# Altium footprint library SEMICONDUCTORS.PcbLib: 91 footprints (part 2 of 6)
Each footprint in its own frame and in the unit in brackets; x right, y up, seen from the top. Pads: shape width x height; smd on the part's side, far side on the other; paste and mask are expansions set on the pad; w line width, h text height; cw(c..) or ccw(c..) is an arc to the next point about the centre after c.
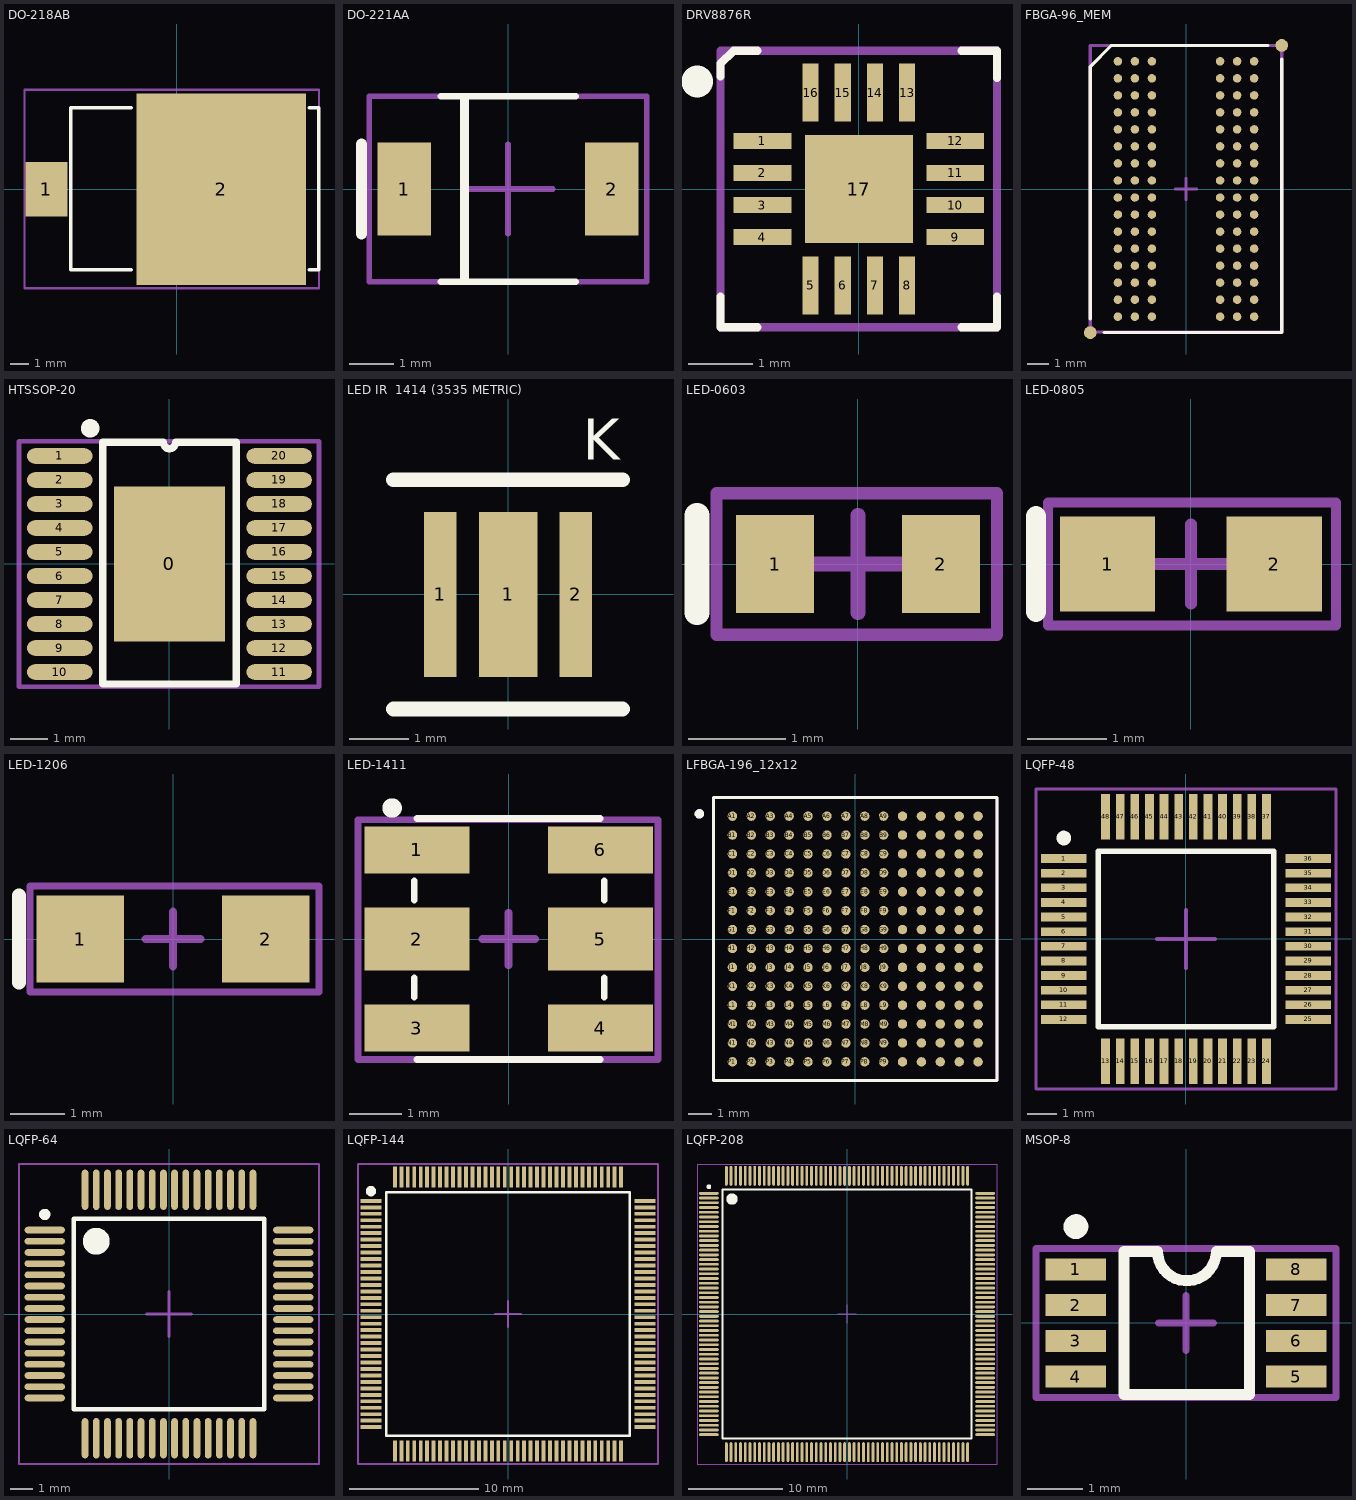
[diagram p1: the footprints below, top view; thin cyan lines are the x and y axes]

## DO-218AB [mm]
height 5
pads (2):
  rect 2.3x3 smd: 1(-7.15,0)
  rect 9.3x10.5 smd: 2(2.45,0)
Top Overlay:
  lines w0.2: -2.503,-4.42 -5.805,-4.42 -5.805,4.47 -2.503,4.47 ; 7.276,-4.42 7.784,-4.42 7.784,4.47 7.276,4.47
Top Assembly:
  lines w0.127: -8.345,-5.425 7.8,-5.425 7.8,5.45 -8.345,5.45 -8.345,-5.425
  text ".Designator" at -1.85,-0.75 h1.5
Top Component Center:
  lines w0.127: -1,0 1,0 ; 0,-1 0,1
Mechanical 15:
  lines w0.1: -1.55,0.025 -0.55,0.025 ; -1.05,-0.475 -1.05,0.525
3D body "DO-218AB.step": height 5, standoff 0, extent -7.7,-5 7.729,5

## DO-221AA [mm]
pads (2):
  rect 1.2x2.07 smd: 1(-2.32,0) 2(2.32,0)
Top Overlay:
  lines w0.15: -1.5,-2.075 1.509,-2.075 ; -1.5,2.075 1.514,2.075
  lines w0.2: -0.975,-1.994 -0.975,2.044
  lines w0.25: -3.275,-1 -3.275,1
Top Assembly:
  lines w0.127: -3.1,-2.075 3.1,-2.075 3.1,2.075 -3.1,2.075 -3.1,-2.075
  text ".Designator" at -2.3,-0.525 h1.2
Top Component Center:
  lines w0.127: -1,0 1,0 ; 0,-1 0,1
3D body "DO-221AA.step": height 1, standoff 0, extent -2.9,-1.975 2.9,1.975

## DRV8876R [mm]
pads (17):
  rect 0.9x0.25 smd: 1(-1.5,0.75) 2(-1.5,0.25) 3(-1.5,-0.25) 4(-1.5,-0.75) 9(1.5,-0.75) 10(1.5,-0.25) 11(1.5,0.25) 12(1.5,0.75)
  rect 0.25x0.9 smd: 5(-0.75,-1.5) 6(-0.25,-1.5) 7(0.25,-1.5) 8(0.75,-1.5) 13(0.75,1.5) 14(0.25,1.5) 15(-0.25,1.5) 16(-0.75,1.5)
  rect 1.68x1.68 smd: 17(0,0)
Top Overlay:
  lines w0.127: -2.15,-1.675 -2.15,-2.15 -1.575,-2.15 ; -2.15,1.75 -2.15,1.95 -1.95,2.15 -1.575,2.15 ; 1.6,-2.15 2.15,-2.15 2.15,-1.675 ; 1.6,2.15 2.15,2.15 2.15,1.725
  lines w0.5: -2.517,1.673 -2.517,1.673
Top Assembly:
  lines w0.127: -2.15,-2.15 -2.15,2.15 2.15,2.15 2.15,-2.15 -2.15,-2.15
  text ".Designator" at -0.75,-0.25 h0.8
Top Component Center:
  lines w0.127: -0.5,0 0.5,0 ; 0,-0.5 0,0.5
3D body: height 0.25, standoff 0, extent 5.225,2.475 5.225,2.475
3D body "DRV8876RGTR.STEP": height 1, standoff 0, extent -1.5,-1.5 1.5,1.5

## FBGA-96_MEM [mm]
pads (98):
  round 0.4 smd: A1(-3.2,6) A2(-2.4,6) A3(-1.6,6) A7(1.6,6) A8(2.4,6) A9(3.2,6) B1(-3.2,5.2) B2(-2.4,5.2) B3(-1.6,5.2) B7(1.6,5.2) B8(2.4,5.2) B9(3.2,5.2) C1(-3.2,4.4) C2(-2.4,4.4) C3(-1.6,4.4) C7(1.6,4.4) C8(2.4,4.4) C9(3.2,4.4) D1(-3.2,3.6) D2(-2.4,3.6) D3(-1.6,3.6) D7(1.6,3.6) D8(2.4,3.6) D9(3.2,3.6) E1(-3.2,2.8) E2(-2.4,2.8) E3(-1.6,2.8) E7(1.6,2.8) E8(2.4,2.8) E9(3.2,2.8) F1(-3.2,2) F2(-2.4,2) F3(-1.6,2) F7(1.6,2) F8(2.4,2) F9(3.2,2) G1(-3.2,1.2) G2(-2.4,1.2) G3(-1.6,1.2) G7(1.6,1.2) G8(2.4,1.2) G9(3.2,1.2) H1(-3.2,0.4) H2(-2.4,0.4) H3(-1.6,0.4) H7(1.6,0.4) H8(2.4,0.4) H9(3.2,0.4) J1(-3.2,-0.4) J2(-2.4,-0.4) J3(-1.6,-0.4) J7(1.6,-0.4) J8(2.4,-0.4) J9(3.2,-0.4) K1(-3.2,-1.2) K2(-2.4,-1.2) K3(-1.6,-1.2) K7(1.6,-1.2) K8(2.4,-1.2) K9(3.2,-1.2) L1(-3.2,-2) L2(-2.4,-2) L3(-1.6,-2) L7(1.6,-2) L8(2.4,-2) L9(3.2,-2) M1(-3.2,-2.8) M2(-2.4,-2.8) M3(-1.6,-2.8) M7(1.6,-2.8) M8(2.4,-2.8) M9(3.2,-2.8) N1(-3.2,-3.6) N2(-2.4,-3.6) N3(-1.6,-3.6) N7(1.6,-3.6) N8(2.4,-3.6) N9(3.2,-3.6) P1(-3.2,-4.4) P2(-2.4,-4.4) P3(-1.6,-4.4) P7(1.6,-4.4) P8(2.4,-4.4) P9(3.2,-4.4) R1(-3.2,-5.2) R2(-2.4,-5.2) R3(-1.6,-5.2) R7(1.6,-5.2) R8(2.4,-5.2) R9(3.2,-5.2) T1(-3.2,-6) T2(-2.4,-6) T3(-1.6,-6) T7(1.6,-6) T8(2.4,-6) T9(3.2,-6)
  round 0.6 smd paste-0.381: FID1(-4.5,-6.75) FID2(4.5,6.75)
Top Overlay:
  lines w0.15: -4.5,-6.1 -4.5,5.75 -3.5,6.75 3.85,6.75 ; -3.85,-6.75 4.5,-6.75 4.5,6.1
Top Assembly:
  lines w0.15: -4.5,-6.725 4.5,-6.725 4.5,6.75 -4.5,6.75 -4.5,-6.725
  text ".Designator" at 0.45,-3.625 h1.2
Top Component Center:
  lines w0.127: -0.5,0 0.5,0 ; 0,-0.5 0,0.5
3D body "FBGA-96_MEM.STEP": height 1.17, standoff -0.03, extent -4.5,-6.5 4.5,6.5

## HTSSOP-20 [mm]
pads (21):
  rect 3x4.2 smd: 0(0,0)
  oval 1.78x0.42 smd: 1(-2.97,2.925) 2(-2.97,2.275) 3(-2.97,1.625) 4(-2.97,0.975) 5(-2.97,0.325) 6(-2.97,-0.325) 7(-2.97,-0.975) 8(-2.97,-1.625) 9(-2.97,-2.275) 10(-2.97,-2.925) 11(2.97,-2.925) 12(2.97,-2.275) 13(2.97,-1.625) 14(2.97,-0.975) 15(2.97,-0.325) 16(2.97,0.325) 17(2.97,0.975) 18(2.97,1.625) 19(2.97,2.275) 20(2.97,2.925)
Top Overlay:
  circle w0.25: c-2.149,3.675 r0.125
  lines w0.2: -1.805,-3.25 1.802,-3.25 1.805,-3.247 1.805,-1.217 1.805,0.814 1.805,3.25 ; -1.805,-3.247 -1.805,3.25 ; -1.805,3.3 -0.162,3.3 ccw(c0,3.288) 0.162,3.3 1.805,3.3 ; -1.751,-3.247 -1.748,-3.25
Top Assembly:
  lines w0.127: -4.075,-3.325 -4.075,3.325 4.05,3.325 4.05,-3.325 -4.075,-3.325
  text ".Designator" at 0.3,-1.725 h1.2
Top Component Center:
  lines w0.127: -0.5,0 0.5,0 ; 0,-0.5 0,0.5
3D body "HTSSOP-20.STEP": height 1.1, standoff 0, extent -3.2,-3.25 3.2,3.25

## LED IR  1414 (3535 METRIC) [mm] "EMITTER IR 850NM 3SMD"
height 3
pads (3):
  rect 0.55x2.8 smd paste-0.05 mask+0.04: 1(-1.15,0) 2(1.15,0)
  rect 1x2.8 smd paste-1 mask+0.04: 1(0.003,0)
Top Overlay:
  lines w0.254: -1.95,-1.95 1.95,-1.95 ; -1.95,1.95 1.95,1.95
  text "K" at 1.27,2.286 h0.7
Top Paste:
  rectangle: -0.45,0.15 0.45,1.35
  rectangle: -0.45,-1.35 0.45,-0.15
3D body: height 0.73, standoff 0, extent -2.032,-1.778 2.032,1.778
3D body: height 2.99, standoff 0.73, extent -1.53,-1.529 1.53,1.53

## LED-0603 [mm]
pads (2):
  rect 0.8x1 smd: 1(-0.85,0) 2(0.85,0)
Top Overlay:
  lines w0.254: -1.65,-0.5 -1.65,0.5
Top Assembly:
  lines w0.127: -1.45,-0.725 -1.45,0.725 1.425,0.725 1.425,-0.725 -1.45,-0.725
  text ".Designator" at -1.35,-0.325 h0.8
Top Component Center:
  lines w0.15: -0.5,0 0.5,0 ; 0,-0.5 0,0.5
3D body: height 1.27, standoff 0, extent -1.775,1.05 -1.775,1.05
3D body: height 1.27, standoff 0, extent -1.775,1.05 -1.775,1.05
3D body: height 0.25, standoff 0, extent -0.8,-0.5 0.8,0.5
3D body: height 0.3, standoff 0, extent -0.812,-0.512 -0.287,0.513
3D body: height 0.3, standoff 0, extent 0.287,-0.512 0.812,0.513
3D body: height 0.55, standoff 0.2, extent -0.55,-0.5 0.55,0.5
3D body: height 0.4, standoff 0.3, extent -0.35,-0.378 0.35,0.378

## LED-0805 [mm]
pads (2):
  rect 1.2x1.2 smd: 1(-1.05,0) 2(1.05,0)
Top Overlay:
  lines w0.254: -1.95,-0.6 -1.95,0.6
Top Assembly:
  lines w0.127: -1.8,-0.775 1.825,-0.775 1.825,0.775 -1.8,0.775 -1.8,-0.775
  text ".Designator" at -1.35,-0.325 h0.8
Top Component Center:
  lines w0.15: -0.5,0 0.5,0 ; 0,-0.5 0,0.5
3D body: height 0.55, standoff 0.45, extent -0.35,-0.378 0.35,0.378
3D body: height 1.1, standoff 0.4, extent -0.7,-0.612 0.7,0.613
3D body: height 0.51, standoff 0, extent 0.488,-0.637 1.012,0.638
3D body: height 0.51, standoff 0, extent -1.012,-0.637 -0.487,0.638
3D body: height 0.5, standoff 0, extent -1,-0.625 1,0.625
3D body: height 1.27, standoff 0, extent -1.775,1.05 -1.775,1.05
3D body: height 1.27, standoff 0, extent -1.775,1.05 -1.775,1.05

## LED-1206 [mm]
pads (2):
  rect 1.6x1.6 smd: 1(-1.7,0) 2(1.7,0)
Top Overlay:
  lines w0.254: -2.825,-0.8 -2.825,0.8
Top Assembly:
  lines w0.127: -2.625,-0.975 2.675,-0.975 2.675,0.975 -2.625,0.975 -2.625,-0.975
  text ".Designator" at -1.587,-0.475 h1
Top Component Center:
  lines w0.15: -0.5,0 0.5,0 ; 0,-0.5 0,0.5
3D body: height 0.51, standoff 0, extent 1.088,-0.806 1.613,0.806
3D body: height 0.55, standoff 0.45, extent -0.35,-0.378 0.35,0.378
3D body: height 1.1, standoff 0.4, extent -0.95,-0.787 0.95,0.788
3D body: height 0.51, standoff 0, extent -1.612,-0.806 -1.087,0.806
3D body: height 0.5, standoff 0, extent -1.587,-0.8 1.587,0.8
3D body: height 1.27, standoff 0, extent -1.775,1.05 -1.775,1.05
3D body: height 1.27, standoff 0, extent -1.775,1.05 -1.775,1.05

## LED-1411 [mm]
pads (6):
  rect 2x0.9 smd: 1(-1.75,1.7) 3(-1.75,-1.7) 4(1.75,-1.7) 6(1.75,1.7)
  rect 2x1.2 smd: 2(-1.75,0) 5(1.75,0)
Top Overlay:
  circle w0.3: c-2.225,2.5 r0.035
  lines w0.127: -1.8,-1.112 -1.8,-0.737 ; -1.8,0.738 -1.8,1.113 ; -1.75,-2.3 1.75,-2.3 ; -1.75,2.3 1.75,2.3 ; 1.825,-1.112 1.825,-0.737 ; 1.825,0.738 1.825,1.113
Top Assembly:
  lines w0.127: -2.875,2.275 2.85,2.275 2.85,-2.3 -2.875,-2.3 -2.875,2.275 ; -2.875,2.275 -2.875,2.275
  text ".Designator" at 0.6,-1.5 h1.2
Top Component Center:
  lines w0.15: -0.5,0 0.5,0 ; 0,-0.5 0,0.5
3D body: height 1, standoff 0, extent 0.009,-0.498 1,0.498
3D body: height 1, standoff 0, extent -0.991,0.402 0,1.399
3D body: height 0.25, standoff 0, extent -1.75,-1.75 1.75,1.75
3D body: height 0.5, standoff 0.25, extent -1.25,-1.75 1.25,1.75
3D body: height 1, standoff 0, extent -0.991,-1.398 0,-0.402
3D body: height 0.25, standoff 0, extent -1.25,3.3 -1.25,3.3
3D body: height 0.26, standoff 0, extent -1.755,1.255 -0.955,1.755
3D body: height 0.26, standoff 0, extent 0.955,1.255 1.755,1.755
3D body: height 0.26, standoff 0, extent 0.955,-1.755 1.755,-1.255
3D body: height 0.26, standoff 0, extent -1.755,-1.755 -0.955,-1.255
3D body: height 0.26, standoff 0, extent -1.755,-0.5 -0.955,0.5
3D body: height 0.26, standoff 0, extent 0.955,-0.5 1.755,0.5
3D body: height 1.27, standoff 0, extent -1.775,1.05 -1.775,1.05
3D body: height 1.27, standoff 0, extent -1.775,1.05 -1.775,1.05

## LFBGA-196_12x12 [mm]
pads (196):
  round 0.4 smd: A1(-5.2,5.2) A2(-4.4,5.2) A3(-3.6,5.2) A4(-2.8,5.2) A5(-2,5.2) A6(-1.2,5.2) A7(-0.4,5.2) A8(0.4,5.2) A9(1.2,5.2) A10(2,5.2) A11(2.8,5.2) A12(3.6,5.2) A13(4.4,5.2) A14(5.2,5.2) B1(-5.2,4.4) B2(-4.4,4.4) B3(-3.6,4.4) B4(-2.8,4.4) B5(-2,4.4) B6(-1.2,4.4) B7(-0.4,4.4) B8(0.4,4.4) B9(1.2,4.4) B10(2,4.4) B11(2.8,4.4) B12(3.6,4.4) B13(4.4,4.4) B14(5.2,4.4) C1(-5.2,3.6) C2(-4.4,3.6) C3(-3.6,3.6) C4(-2.8,3.6) C5(-2,3.6) C6(-1.2,3.6) C7(-0.4,3.6) C8(0.4,3.6) C9(1.2,3.6) C10(2,3.6) C11(2.8,3.6) C12(3.6,3.6) C13(4.4,3.6) C14(5.2,3.6) D1(-5.2,2.8) D2(-4.4,2.8) D3(-3.6,2.8) D4(-2.8,2.8) D5(-2,2.8) D6(-1.2,2.8) D7(-0.4,2.8) D8(0.4,2.8) D9(1.2,2.8) D10(2,2.8) D11(2.8,2.8) D12(3.6,2.8) D13(4.4,2.8) D14(5.2,2.8) E1(-5.2,2) E2(-4.4,2) E3(-3.6,2) E4(-2.8,2) E5(-2,2) E6(-1.2,2) E7(-0.4,2) E8(0.4,2) E9(1.2,2) E10(2,2) E11(2.8,2) E12(3.6,2) E13(4.4,2) E14(5.2,2) F1(-5.2,1.2) F2(-4.4,1.2) F3(-3.6,1.2) F4(-2.8,1.2) F5(-2,1.2) F6(-1.2,1.2) F7(-0.4,1.2) F8(0.4,1.2) F9(1.2,1.2) F10(2,1.2) F11(2.8,1.2) F12(3.6,1.2) F13(4.4,1.2) F14(5.2,1.2) G1(-5.2,0.4) G2(-4.4,0.4) G3(-3.6,0.4) G4(-2.8,0.4) G5(-2,0.4) G6(-1.2,0.4) G7(-0.4,0.4) G8(0.4,0.4) G9(1.2,0.4) G10(2,0.4) G11(2.8,0.4) G12(3.6,0.4) G13(4.4,0.4) G14(5.2,0.4) H1(-5.2,-0.4) H2(-4.4,-0.4) H3(-3.6,-0.4) H4(-2.8,-0.4) H5(-2,-0.4) H6(-1.2,-0.4) H7(-0.4,-0.4) H8(0.4,-0.4) H9(1.2,-0.4) H10(2,-0.4) H11(2.8,-0.4) H12(3.6,-0.4) H13(4.4,-0.4) H14(5.2,-0.4) J1(-5.2,-1.2) J2(-4.4,-1.2) J3(-3.6,-1.2) J4(-2.8,-1.2) J5(-2,-1.2) J6(-1.2,-1.2) J7(-0.4,-1.2) J8(0.4,-1.2) J9(1.2,-1.2) J10(2,-1.2) J11(2.8,-1.2) J12(3.6,-1.2) J13(4.4,-1.2) J14(5.2,-1.2) K1(-5.2,-2) K2(-4.4,-2) K3(-3.6,-2) K4(-2.8,-2) K5(-2,-2) K6(-1.2,-2) K7(-0.4,-2) K8(0.4,-2) K9(1.2,-2) K10(2,-2) K11(2.8,-2) K12(3.6,-2) K13(4.4,-2) K14(5.2,-2) L1(-5.2,-2.8) L2(-4.4,-2.8) L3(-3.6,-2.8) L4(-2.8,-2.8) L5(-2,-2.8) L6(-1.2,-2.8) L7(-0.4,-2.8) L8(0.4,-2.8) L9(1.2,-2.8) L10(2,-2.8) L11(2.8,-2.8) L12(3.6,-2.8) L13(4.4,-2.8) L14(5.2,-2.8) M1(-5.2,-3.6) M2(-4.4,-3.6) M3(-3.6,-3.6) M4(-2.8,-3.6) M5(-2,-3.6) M6(-1.2,-3.6) M7(-0.4,-3.6) M8(0.4,-3.6) M9(1.2,-3.6) M10(2,-3.6) M11(2.8,-3.6) M12(3.6,-3.6) M13(4.4,-3.6) M14(5.2,-3.6) N1(-5.2,-4.4) N2(-4.4,-4.4) N3(-3.6,-4.4) N4(-2.8,-4.4) N5(-2,-4.4) N6(-1.2,-4.4) N7(-0.4,-4.4) N8(0.4,-4.4) N9(1.2,-4.4) N10(2,-4.4) N11(2.8,-4.4) N12(3.6,-4.4) N13(4.4,-4.4) N14(5.2,-4.4) P1(-5.2,-5.2) P2(-4.4,-5.2) P3(-3.6,-5.2) P4(-2.8,-5.2) P5(-2,-5.2) P6(-1.2,-5.2) P7(-0.4,-5.2) P8(0.4,-5.2) P9(1.2,-5.2) P10(2,-5.2) P11(2.8,-5.2) P12(3.6,-5.2) P13(4.4,-5.2) P14(5.2,-5.2)
Top Overlay:
  circle w0.2: c-6.6,5.3 r0.1
  lines w0.127: -6,-6 6,-6 ; -6,-6 -6,6 ; -6,-6 6,-6 ; -6,-6 -6,6 ; -6,6 6,6 ; -6,6 6,6 ; 6,-6 6,6 ; 6,-6 6,6
Top Assembly:
  lines w0.127: -6,-6 6,-6 6,6 -6,6 -6,-6
  text ".Designator" at -2.625,-0.85 h2
Mechanical 13:
  circle w0.2: c-6.6,5.3 r0.1
3D body: height 0.37, standoff -0.05, extent -4.609,4.993 -4.19,5.407
3D body: height 0.37, standoff -0.05, extent -3.809,4.993 -3.39,5.407
3D body: height 0.37, standoff -0.05, extent -1.409,4.993 -0.99,5.407
3D body: height 0.37, standoff -0.05, extent -2.209,4.993 -1.79,5.407
3D body: height 0.37, standoff -0.05, extent -3.009,4.993 -2.59,5.407
3D body: height 0.37, standoff -0.05, extent 0.991,4.993 1.41,5.407
3D body: height 0.37, standoff -0.05, extent 0.191,4.993 0.61,5.407
3D body: height 0.37, standoff -0.05, extent -0.609,4.993 -0.19,5.407
3D body: height 0.37, standoff -0.05, extent 3.391,4.993 3.81,5.407
3D body: height 0.37, standoff -0.05, extent 2.591,4.993 3.01,5.407
3D body: height 0.37, standoff -0.05, extent 1.791,4.993 2.21,5.407
3D body: height 0.37, standoff -0.05, extent 4.991,4.993 5.41,5.407
3D body: height 0.37, standoff -0.05, extent 4.191,4.993 4.61,5.407
3D body: height 0.37, standoff -0.05, extent 4.191,4.193 4.61,4.607
3D body: height 0.37, standoff -0.05, extent 4.991,4.193 5.41,4.607
3D body: height 0.37, standoff -0.05, extent 1.791,4.193 2.21,4.607
3D body: height 0.37, standoff -0.05, extent 2.591,4.193 3.01,4.607
3D body: height 0.37, standoff -0.05, extent 3.391,4.193 3.81,4.607
3D body: height 0.37, standoff -0.05, extent -0.609,4.193 -0.19,4.607
3D body: height 0.37, standoff -0.05, extent 0.191,4.193 0.61,4.607
3D body: height 0.37, standoff -0.05, extent 0.991,4.193 1.41,4.607
3D body: height 0.37, standoff -0.05, extent -3.009,4.193 -2.59,4.607
3D body: height 0.37, standoff -0.05, extent -2.209,4.193 -1.79,4.607
3D body: height 0.37, standoff -0.05, extent -1.409,4.193 -0.99,4.607
3D body: height 0.37, standoff -0.05, extent -3.809,4.193 -3.39,4.607
3D body: height 0.37, standoff -0.05, extent -4.609,4.193 -4.19,4.607
3D body: height 0.37, standoff -0.05, extent -5.409,4.193 -4.99,4.607
3D body: height 0.37, standoff -0.05, extent 4.192,3.393 4.611,3.807
3D body: height 0.37, standoff -0.05, extent 4.991,3.393 5.411,3.807
3D body: height 0.37, standoff -0.05, extent 1.791,3.393 2.211,3.807
3D body: height 0.37, standoff -0.05, extent 2.591,3.393 3.011,3.807
3D body: height 0.37, standoff -0.05, extent 3.391,3.393 3.811,3.807
3D body: height 0.37, standoff -0.05, extent -0.609,3.393 -0.189,3.807
3D body: height 0.37, standoff -0.05, extent 0.191,3.393 0.611,3.807
3D body: height 0.37, standoff -0.05, extent 0.991,3.393 1.411,3.807
3D body: height 0.37, standoff -0.05, extent -3.008,3.393 -2.589,3.807
3D body: height 0.37, standoff -0.05, extent -2.209,3.393 -1.789,3.807
3D body: height 0.37, standoff -0.05, extent -1.409,3.393 -0.989,3.807
3D body: height 0.37, standoff -0.05, extent -3.809,3.393 -3.389,3.807
3D body: height 0.37, standoff -0.05, extent -4.608,3.393 -4.189,3.807
3D body: height 0.37, standoff -0.05, extent -5.408,3.393 -4.989,3.807
3D body: height 0.37, standoff -0.05, extent 4.191,2.593 4.61,3.007
3D body: height 0.37, standoff -0.05, extent 4.991,2.593 5.41,3.007
3D body: height 0.37, standoff -0.05, extent 1.791,2.593 2.21,3.007
3D body: height 0.37, standoff -0.05, extent 2.591,2.593 3.01,3.007
3D body: height 0.37, standoff -0.05, extent 3.391,2.593 3.81,3.007
3D body: height 0.37, standoff -0.05, extent -0.609,2.593 -0.19,3.007
3D body: height 0.37, standoff -0.05, extent 0.191,2.593 0.61,3.007
3D body: height 0.37, standoff -0.05, extent 0.991,2.593 1.41,3.007
3D body: height 0.37, standoff -0.05, extent -3.009,2.593 -2.59,3.007
3D body: height 0.37, standoff -0.05, extent -2.209,2.593 -1.79,3.007
3D body: height 0.37, standoff -0.05, extent -1.409,2.593 -0.99,3.007
3D body: height 0.37, standoff -0.05, extent -3.809,2.593 -3.39,3.007
3D body: height 0.37, standoff -0.05, extent -4.609,2.593 -4.19,3.007
3D body: height 0.37, standoff -0.05, extent -5.409,2.593 -4.99,3.007
3D body: height 0.37, standoff -0.05, extent -5.409,-0.607 -4.99,-0.193
3D body: height 0.37, standoff -0.05, extent -4.609,-0.607 -4.19,-0.193
3D body: height 0.37, standoff -0.05, extent -3.809,-0.607 -3.39,-0.193
3D body: height 0.37, standoff -0.05, extent -1.409,-0.607 -0.99,-0.193
3D body: height 0.37, standoff -0.05, extent -2.209,-0.607 -1.79,-0.193
3D body: height 0.37, standoff -0.05, extent -3.009,-0.607 -2.59,-0.193
3D body: height 0.37, standoff -0.05, extent 0.991,-0.607 1.41,-0.193
3D body: height 0.37, standoff -0.05, extent 0.191,-0.607 0.61,-0.193
3D body: height 0.37, standoff -0.05, extent -0.609,-0.607 -0.19,-0.193
3D body: height 0.37, standoff -0.05, extent 3.391,-0.607 3.81,-0.193
3D body: height 0.37, standoff -0.05, extent 2.591,-0.607 3.01,-0.193
3D body: height 0.37, standoff -0.05, extent 1.791,-0.607 2.21,-0.193
3D body: height 0.37, standoff -0.05, extent 4.991,-0.607 5.41,-0.193
3D body: height 0.37, standoff -0.05, extent 4.191,-0.607 4.61,-0.193
3D body: height 0.37, standoff -0.05, extent -5.409,0.193 -4.989,0.607
3D body: height 0.37, standoff -0.05, extent -4.608,0.193 -4.189,0.607
3D body: height 0.37, standoff -0.05, extent -3.809,0.193 -3.389,0.607
3D body: height 0.37, standoff -0.05, extent -1.409,0.193 -0.989,0.607
3D body: height 0.37, standoff -0.05, extent -2.209,0.193 -1.789,0.607
3D body: height 0.37, standoff -0.05, extent -3.008,0.193 -2.589,0.607
3D body: height 0.37, standoff -0.05, extent 0.991,0.193 1.411,0.607
3D body: height 0.37, standoff -0.05, extent 0.191,0.193 0.611,0.607
3D body: height 0.37, standoff -0.05, extent -0.609,0.193 -0.189,0.607
3D body: height 0.37, standoff -0.05, extent 3.391,0.193 3.811,0.607
3D body: height 0.37, standoff -0.05, extent 2.591,0.193 3.011,0.607
3D body: height 0.37, standoff -0.05, extent 1.791,0.193 2.211,0.607
3D body: height 0.37, standoff -0.05, extent 4.991,0.193 5.411,0.607
3D body: height 0.37, standoff -0.05, extent 4.191,0.193 4.611,0.607
3D body: height 0.37, standoff -0.05, extent -5.409,0.993 -4.99,1.407
3D body: height 0.37, standoff -0.05, extent -4.609,0.993 -4.19,1.407
3D body: height 0.37, standoff -0.05, extent -3.809,0.993 -3.39,1.407
3D body: height 0.37, standoff -0.05, extent -1.409,0.993 -0.99,1.407
3D body: height 0.37, standoff -0.05, extent -2.209,0.993 -1.79,1.407
3D body: height 0.37, standoff -0.05, extent -3.009,0.993 -2.59,1.407
3D body: height 0.37, standoff -0.05, extent 0.991,0.993 1.41,1.407
3D body: height 0.37, standoff -0.05, extent 0.191,0.993 0.61,1.407
3D body: height 0.37, standoff -0.05, extent -0.609,0.993 -0.19,1.407
3D body: height 0.37, standoff -0.05, extent 3.391,0.993 3.81,1.407
3D body: height 0.37, standoff -0.05, extent 2.591,0.993 3.01,1.407
3D body: height 0.37, standoff -0.05, extent 1.791,0.993 2.21,1.407
3D body: height 0.37, standoff -0.05, extent 4.991,0.993 5.41,1.407
3D body: height 0.37, standoff -0.05, extent 4.191,0.993 4.61,1.407
3D body: height 0.37, standoff -0.05, extent 4.191,1.793 4.61,2.207
3D body: height 0.37, standoff -0.05, extent 4.991,1.793 5.41,2.207
3D body: height 0.37, standoff -0.05, extent 1.791,1.793 2.21,2.207
3D body: height 0.37, standoff -0.05, extent 2.591,1.793 3.01,2.207
3D body: height 0.37, standoff -0.05, extent 3.391,1.793 3.81,2.207
3D body: height 0.37, standoff -0.05, extent -0.609,1.793 -0.19,2.207
3D body: height 0.37, standoff -0.05, extent 0.191,1.793 0.61,2.207
3D body: height 0.37, standoff -0.05, extent 0.991,1.793 1.41,2.207
3D body: height 0.37, standoff -0.05, extent -3.009,1.793 -2.59,2.207
3D body: height 0.37, standoff -0.05, extent -2.209,1.793 -1.79,2.207
3D body: height 0.37, standoff -0.05, extent -1.409,1.793 -0.99,2.207
3D body: height 0.37, standoff -0.05, extent -3.809,1.793 -3.39,2.207
3D body: height 0.37, standoff -0.05, extent -4.609,1.793 -4.19,2.207
3D body: height 0.37, standoff -0.05, extent -5.409,1.793 -4.99,2.207
3D body: height 0.37, standoff -0.05, extent -5.409,-3.807 -4.99,-3.393
3D body: height 0.37, standoff -0.05, extent -4.609,-3.807 -4.19,-3.393
3D body: height 0.37, standoff -0.05, extent -3.809,-3.807 -3.39,-3.393
3D body: height 0.37, standoff -0.05, extent -1.409,-3.807 -0.99,-3.393
3D body: height 0.37, standoff -0.05, extent -2.209,-3.807 -1.79,-3.393
3D body: height 0.37, standoff -0.05, extent -3.009,-3.807 -2.59,-3.393
3D body: height 0.37, standoff -0.05, extent 0.991,-3.807 1.41,-3.393
3D body: height 0.37, standoff -0.05, extent 0.191,-3.807 0.61,-3.393
3D body: height 0.37, standoff -0.05, extent -0.609,-3.807 -0.19,-3.393
3D body: height 0.37, standoff -0.05, extent 3.391,-3.807 3.81,-3.393
3D body: height 0.37, standoff -0.05, extent 2.591,-3.807 3.01,-3.393
3D body: height 0.37, standoff -0.05, extent 1.791,-3.807 2.21,-3.393
3D body: height 0.37, standoff -0.05, extent 4.991,-3.807 5.41,-3.393
3D body: height 0.37, standoff -0.05, extent 4.191,-3.807 4.61,-3.393
3D body: height 0.37, standoff -0.05, extent -5.409,-3.007 -4.989,-2.593
3D body: height 0.37, standoff -0.05, extent -4.608,-3.007 -4.189,-2.593
3D body: height 0.37, standoff -0.05, extent -3.809,-3.007 -3.389,-2.593
3D body: height 0.37, standoff -0.05, extent -1.409,-3.007 -0.989,-2.593
3D body: height 0.37, standoff -0.05, extent -2.209,-3.007 -1.789,-2.593
3D body: height 0.37, standoff -0.05, extent -3.008,-3.007 -2.589,-2.593
3D body: height 0.37, standoff -0.05, extent 0.991,-3.007 1.411,-2.593
3D body: height 0.37, standoff -0.05, extent 0.191,-3.007 0.611,-2.593
3D body: height 0.37, standoff -0.05, extent -0.609,-3.007 -0.189,-2.593
3D body: height 0.37, standoff -0.05, extent 3.391,-3.007 3.811,-2.593
3D body: height 0.37, standoff -0.05, extent 2.591,-3.007 3.011,-2.593
3D body: height 0.37, standoff -0.05, extent 1.791,-3.007 2.211,-2.593
3D body: height 0.37, standoff -0.05, extent 4.991,-3.007 5.411,-2.593
3D body: height 0.37, standoff -0.05, extent 4.191,-3.007 4.611,-2.593
3D body: height 0.37, standoff -0.05, extent -5.409,-2.207 -4.99,-1.793
3D body: height 0.37, standoff -0.05, extent -4.609,-2.207 -4.19,-1.793
3D body: height 0.37, standoff -0.05, extent -3.809,-2.207 -3.39,-1.793
3D body: height 0.37, standoff -0.05, extent -1.409,-2.207 -0.99,-1.793
3D body: height 0.37, standoff -0.05, extent -2.209,-2.207 -1.79,-1.793
3D body: height 0.37, standoff -0.05, extent -3.009,-2.207 -2.59,-1.793
3D body: height 0.37, standoff -0.05, extent 0.991,-2.207 1.41,-1.793
3D body: height 0.37, standoff -0.05, extent 0.191,-2.207 0.61,-1.793
3D body: height 0.37, standoff -0.05, extent -0.609,-2.207 -0.19,-1.793
3D body: height 0.37, standoff -0.05, extent 3.391,-2.207 3.81,-1.793
3D body: height 0.37, standoff -0.05, extent 2.591,-2.207 3.01,-1.793
3D body: height 0.37, standoff -0.05, extent 1.791,-2.207 2.21,-1.793
3D body: height 0.37, standoff -0.05, extent 4.991,-2.207 5.41,-1.793
3D body: height 0.37, standoff -0.05, extent 4.191,-2.207 4.61,-1.793
3D body: height 0.37, standoff -0.05, extent 4.191,-1.407 4.61,-0.993
3D body: height 0.37, standoff -0.05, extent 4.991,-1.407 5.41,-0.993
3D body: height 0.37, standoff -0.05, extent 1.791,-1.407 2.21,-0.993
3D body: height 0.37, standoff -0.05, extent 2.591,-1.407 3.01,-0.993
3D body: height 0.37, standoff -0.05, extent 3.391,-1.407 3.81,-0.993
3D body: height 0.37, standoff -0.05, extent -0.609,-1.407 -0.19,-0.993
3D body: height 0.37, standoff -0.05, extent 0.191,-1.407 0.61,-0.993
3D body: height 0.37, standoff -0.05, extent 0.991,-1.407 1.41,-0.993
3D body: height 0.37, standoff -0.05, extent -3.009,-1.407 -2.59,-0.993
3D body: height 0.37, standoff -0.05, extent -2.209,-1.407 -1.79,-0.993
3D body: height 0.37, standoff -0.05, extent -1.409,-1.407 -0.99,-0.993
3D body: height 0.37, standoff -0.05, extent -3.809,-1.407 -3.39,-0.993
3D body: height 0.37, standoff -0.05, extent -4.609,-1.407 -4.19,-0.993
3D body: height 0.37, standoff -0.05, extent -5.409,-1.407 -4.99,-0.993
3D body: height 0.37, standoff -0.05, extent -5.409,-5.407 -4.99,-4.993
3D body: height 0.37, standoff -0.05, extent -4.609,-5.407 -4.19,-4.993
3D body: height 0.37, standoff -0.05, extent -3.809,-5.407 -3.39,-4.993
3D body: height 0.37, standoff -0.05, extent -1.409,-5.407 -0.99,-4.993
3D body: height 0.37, standoff -0.05, extent -2.209,-5.407 -1.79,-4.993
3D body: height 0.37, standoff -0.05, extent -3.009,-5.407 -2.59,-4.993
3D body: height 0.37, standoff -0.05, extent 0.991,-5.407 1.41,-4.993
3D body: height 0.37, standoff -0.05, extent 0.191,-5.407 0.61,-4.993
3D body: height 0.37, standoff -0.05, extent -0.609,-5.407 -0.19,-4.993
3D body: height 0.37, standoff -0.05, extent 3.391,-5.407 3.81,-4.993
3D body: height 0.37, standoff -0.05, extent 2.591,-5.407 3.01,-4.993
3D body: height 0.37, standoff -0.05, extent 1.791,-5.407 2.21,-4.993
3D body: height 0.37, standoff -0.05, extent 4.991,-5.407 5.41,-4.993
3D body: height 0.37, standoff -0.05, extent 4.191,-5.407 4.61,-4.993
3D body: height 0.37, standoff -0.05, extent 4.191,-4.607 4.61,-4.193
3D body: height 0.37, standoff -0.05, extent 4.991,-4.607 5.41,-4.193
3D body: height 0.37, standoff -0.05, extent 1.791,-4.607 2.21,-4.193
3D body: height 0.37, standoff -0.05, extent 2.591,-4.607 3.01,-4.193
3D body: height 0.37, standoff -0.05, extent 3.391,-4.607 3.81,-4.193
3D body: height 0.37, standoff -0.05, extent -0.609,-4.607 -0.19,-4.193
3D body: height 0.37, standoff -0.05, extent 0.191,-4.607 0.61,-4.193
3D body: height 0.37, standoff -0.05, extent 0.991,-4.607 1.41,-4.193
3D body: height 0.37, standoff -0.05, extent -3.009,-4.607 -2.59,-4.193
3D body: height 0.37, standoff -0.05, extent -2.209,-4.607 -1.79,-4.193
3D body: height 0.37, standoff -0.05, extent -1.409,-4.607 -0.99,-4.193
3D body: height 0.37, standoff -0.05, extent -3.809,-4.607 -3.39,-4.193
3D body: height 0.37, standoff -0.05, extent -4.609,-4.607 -4.19,-4.193
3D body: height 0.37, standoff -0.05, extent -5.409,-4.607 -4.99,-4.193
3D body: height 1.27, standoff 0, extent -6,6 -6,6
3D body: height 1.52, standoff 0.26, extent -6,-6 6,6
3D body: height 0.37, standoff -0.05, extent -5.41,4.993 -4.99,5.407
3D body: height 1.53, standoff 0.53, extent -5.048,4.551 -4.55,5.05

## LQFP-48 [mm]
pads (48):
  rect 1.55x0.3 smd: 1(-4.175,2.75) 2(-4.175,2.25) 3(-4.175,1.75) 4(-4.175,1.25) 5(-4.175,0.75) 6(-4.175,0.25) 7(-4.175,-0.25) 8(-4.175,-0.75) 9(-4.175,-1.25) 10(-4.175,-1.75) 11(-4.175,-2.25) 12(-4.175,-2.75) 25(4.175,-2.75) 26(4.175,-2.25) 27(4.175,-1.75) 28(4.175,-1.25) 29(4.175,-0.75) 30(4.175,-0.25) 31(4.175,0.25) 32(4.175,0.75) 33(4.175,1.25) 34(4.175,1.75) 35(4.175,2.25) 36(4.175,2.75)
  rect 0.3x1.55 smd: 13(-2.75,-4.175) 14(-2.25,-4.175) 15(-1.75,-4.175) 16(-1.25,-4.175) 17(-0.75,-4.175) 18(-0.25,-4.175) 19(0.25,-4.175) 20(0.75,-4.175) 21(1.25,-4.175) 22(1.75,-4.175) 23(2.25,-4.175) 24(2.75,-4.175) 37(2.75,4.175) 38(2.25,4.175) 39(1.75,4.175) 40(1.25,4.175) 41(0.75,4.175) 42(0.25,4.175) 43(-0.25,4.175) 44(-0.75,4.175) 45(-1.25,4.175) 46(-1.75,4.175) 47(-2.25,4.175) 48(-2.75,4.175)
Top Overlay:
  circle w0.25: c-4.175,3.45 r0.125
  lines w0.2: -3,-3 3,-3 3,3 -3,3 -3,-3
Top Assembly:
  lines w0.1: -5.125,-5.125 5.125,-5.125 5.125,5.125 -5.125,5.125 -5.125,-5.125
  text ".Designator" at -2.175,-0.575 h1.5
Top Component Center:
  lines w0.127: -1,0 1,0 ; 0,-1 0,1
3D body "LQFP-48.STEP": height 1.6, standoff 0, extent -4.5,-4.5 4.5,4.5

## LQFP-64 [mm]
height 1.6
pads (64):
  oval 1.8x0.3 smd: 1(-5.55,3.75) 2(-5.55,3.25) 3(-5.55,2.75) 4(-5.55,2.25) 5(-5.55,1.75) 6(-5.55,1.25) 7(-5.55,0.75) 8(-5.55,0.25) 9(-5.55,-0.25) 10(-5.55,-0.75) 11(-5.55,-1.25) 12(-5.55,-1.75) 13(-5.55,-2.25) 14(-5.55,-2.75) 15(-5.55,-3.25) 16(-5.55,-3.75) 33(5.55,-3.75) 34(5.55,-3.25) 35(5.55,-2.75) 36(5.55,-2.25) 37(5.55,-1.75) 38(5.55,-1.25) 39(5.55,-0.75) 40(5.55,-0.25) 41(5.55,0.25) 42(5.55,0.75) 43(5.55,1.25) 44(5.55,1.75) 45(5.55,2.25) 46(5.55,2.75) 47(5.55,3.25) 48(5.55,3.75)
  oval 0.3x1.8 smd: 17(-3.75,-5.55) 18(-3.25,-5.55) 19(-2.75,-5.55) 20(-2.25,-5.55) 21(-1.75,-5.55) 22(-1.25,-5.55) 23(-0.75,-5.55) 24(-0.25,-5.55) 25(0.25,-5.55) 26(0.75,-5.55) 27(1.25,-5.55) 28(1.75,-5.55) 29(2.25,-5.55) 30(2.75,-5.55) 31(3.25,-5.55) 32(3.75,-5.55) 49(3.75,5.55) 50(3.25,5.55) 51(2.75,5.55) 52(2.25,5.55) 53(1.75,5.55) 54(1.25,5.55) 55(0.75,5.55) 56(0.25,5.55) 57(-0.25,5.55) 58(-0.75,5.55) 59(-1.25,5.55) 60(-1.75,5.55) 61(-2.25,5.55) 62(-2.75,5.55) 63(-3.25,5.55) 64(-3.75,5.55)
Top Overlay:
  circle w0.6: c-3.25,3.25 r0.3
  circle w0.25: c-5.55,4.45 r0.125
  lines w0.2: -4.25,-4.25 4.25,-4.25 4.25,4.25 -4.25,4.25 -4.25,-4.25
Top Assembly:
  lines w0.1: -6.7,-6.7 6.7,-6.7 6.7,6.7 -6.7,6.7 -6.7,-6.7
  text ".Designator" at -2.2,-0.65 h1.5
Top Component Center:
  lines w0.127: -1,0 1,0 ; 0,-1 0,1
3D body "LQFP-64.STEP": height 1.6, standoff 0, extent -6,-6 6,6

## LQFP-144 [mm]
pads (144):
  rect 1.6x0.3 smd: 1(-10.6,8.75) 2(-10.6,8.25) 3(-10.6,7.75) 4(-10.6,7.25) 5(-10.6,6.75) 6(-10.6,6.25) 7(-10.6,5.75) 8(-10.6,5.25) 9(-10.6,4.75) 10(-10.6,4.25) 11(-10.6,3.75) 12(-10.6,3.25) 13(-10.6,2.75) 14(-10.6,2.25) 15(-10.6,1.75) 16(-10.6,1.25) 17(-10.6,0.75) 18(-10.6,0.25) 19(-10.6,-0.25) 20(-10.6,-0.75) 21(-10.6,-1.25) 22(-10.6,-1.75) 23(-10.6,-2.25) 24(-10.6,-2.75) 25(-10.6,-3.25) 26(-10.6,-3.75) 27(-10.6,-4.25) 28(-10.6,-4.75) 29(-10.6,-5.25) 30(-10.6,-5.75) 31(-10.6,-6.25) 32(-10.6,-6.75) 33(-10.6,-7.25) 34(-10.6,-7.75) 35(-10.6,-8.25) 36(-10.6,-8.75) 73(10.6,-8.75) 74(10.6,-8.25) 75(10.6,-7.75) 76(10.6,-7.25) 77(10.6,-6.75) 78(10.6,-6.25) 79(10.6,-5.75) 80(10.6,-5.25) 81(10.6,-4.75) 82(10.6,-4.25) 83(10.6,-3.75) 84(10.6,-3.25) 85(10.6,-2.75) 86(10.6,-2.25) 87(10.6,-1.75) 88(10.6,-1.25) 89(10.6,-0.75) 90(10.6,-0.25) 91(10.6,0.25) 92(10.6,0.75) 93(10.6,1.25) 94(10.6,1.75) 95(10.6,2.25) 96(10.6,2.75) 97(10.6,3.25) 98(10.6,3.75) 99(10.6,4.25) 100(10.6,4.75) 101(10.6,5.25) 102(10.6,5.75) 103(10.6,6.25) 104(10.6,6.75) 105(10.6,7.25) 106(10.6,7.75) 107(10.6,8.25) 108(10.6,8.75)
  rect 0.3x1.6 smd: 37(-8.75,-10.6) 38(-8.25,-10.6) 39(-7.75,-10.6) 40(-7.25,-10.6) 41(-6.75,-10.6) 42(-6.25,-10.6) 43(-5.75,-10.6) 44(-5.25,-10.6) 45(-4.75,-10.6) 46(-4.25,-10.6) 47(-3.75,-10.6) 48(-3.25,-10.6) 49(-2.75,-10.6) 50(-2.25,-10.6) 51(-1.75,-10.6) 52(-1.25,-10.6) 53(-0.75,-10.6) 54(-0.25,-10.6) 55(0.25,-10.6) 56(0.75,-10.6) 57(1.25,-10.6) 58(1.75,-10.6) 59(2.25,-10.6) 60(2.75,-10.6) 61(3.25,-10.6) 62(3.75,-10.6) 63(4.25,-10.6) 64(4.75,-10.6) 65(5.25,-10.6) 66(5.75,-10.6) 67(6.25,-10.6) 68(6.75,-10.6) 69(7.25,-10.6) 70(7.75,-10.6) 71(8.25,-10.6) 72(8.75,-10.6) 109(8.75,10.6) 110(8.25,10.6) 111(7.75,10.6) 112(7.25,10.6) 113(6.75,10.6) 114(6.25,10.6) 115(5.75,10.6) 116(5.25,10.6) 117(4.75,10.6) 118(4.25,10.6) 119(3.75,10.6) 120(3.25,10.6) 121(2.75,10.6) 122(2.25,10.6) 123(1.75,10.6) 124(1.25,10.6) 125(0.75,10.6) 126(0.25,10.6) 127(-0.25,10.6) 128(-0.75,10.6) 129(-1.25,10.6) 130(-1.75,10.6) 131(-2.25,10.6) 132(-2.75,10.6) 133(-3.25,10.6) 134(-3.75,10.6) 135(-4.25,10.6) 136(-4.75,10.6) 137(-5.25,10.6) 138(-5.75,10.6) 139(-6.25,10.6) 140(-6.75,10.6) 141(-7.25,10.6) 142(-7.75,10.6) 143(-8.25,10.6) 144(-8.75,10.6)
Top Overlay:
  lines w0.2: -9.4,-9.4 9.4,-9.4 9.4,9.4 -9.4,9.4 -9.4,-9.4
  lines w0.5: -10.451,9.514 ccw(c-10.6,9.5) -10.45,9.505
Top Assembly:
  lines w0.127: -11.6,-11.6 -11.6,11.6 11.6,11.6 11.6,-11.6 -11.6,-11.6
  text ".Designator" at -3,-0.85 h2
Top Component Center:
  lines w0.127: -1,0 1,0 ; 0,-1 0,1
3D body "LQFP-144.STEP": height 1.88, standoff -0.01, extent -11.101,-11.101 11.101,11.101

## LQFP-208 [mm]
pads (208):
  oval 2.1x0.3 smd: 1(-14.6,12.75) 2(-14.6,12.25) 3(-14.6,11.75) 4(-14.6,11.25) 5(-14.6,10.75) 6(-14.6,10.25) 7(-14.6,9.75) 8(-14.6,9.25) 9(-14.6,8.75) 10(-14.6,8.25) 11(-14.6,7.75) 12(-14.6,7.25) 13(-14.6,6.75) 14(-14.6,6.25) 15(-14.6,5.75) 16(-14.6,5.25) 17(-14.6,4.75) 18(-14.6,4.25) 19(-14.6,3.75) 20(-14.6,3.25) 21(-14.6,2.75) 22(-14.6,2.25) 23(-14.6,1.75) 24(-14.6,1.25) 25(-14.6,0.75) 26(-14.6,0.25) 27(-14.6,-0.25) 28(-14.6,-0.75) 29(-14.6,-1.25) 30(-14.6,-1.75) 31(-14.6,-2.25) 32(-14.6,-2.75) 33(-14.6,-3.25) 34(-14.6,-3.75) 35(-14.6,-4.25) 36(-14.6,-4.75) 37(-14.6,-5.25) 38(-14.6,-5.75) 39(-14.6,-6.25) 40(-14.6,-6.75) 41(-14.6,-7.25) 42(-14.6,-7.75) 43(-14.6,-8.25) 44(-14.6,-8.75) 45(-14.6,-9.25) 46(-14.6,-9.75) 47(-14.6,-10.25) 48(-14.6,-10.75) 49(-14.6,-11.25) 50(-14.6,-11.75) 51(-14.6,-12.25) 52(-14.6,-12.75) 105(14.6,-12.75) 106(14.6,-12.25) 107(14.6,-11.75) 108(14.6,-11.25) 109(14.6,-10.75) 110(14.6,-10.25) 111(14.6,-9.75) 112(14.6,-9.25) 113(14.6,-8.75) 114(14.6,-8.25) 115(14.6,-7.75) 116(14.6,-7.25) 117(14.6,-6.75) 118(14.6,-6.25) 119(14.6,-5.75) 120(14.6,-5.25) 121(14.6,-4.75) 122(14.6,-4.25) 123(14.6,-3.75) 124(14.6,-3.25) 125(14.6,-2.75) 126(14.6,-2.25) 127(14.6,-1.75) 128(14.6,-1.25) 129(14.6,-0.75) 130(14.6,-0.25) 131(14.6,0.25) 132(14.6,0.75) 133(14.6,1.25) 134(14.6,1.75) 135(14.6,2.25) 136(14.6,2.75) 137(14.6,3.25) 138(14.6,3.75) 139(14.6,4.25) 140(14.6,4.75) 141(14.6,5.25) 142(14.6,5.75) 143(14.6,6.25) 144(14.6,6.75) 145(14.6,7.25) 146(14.6,7.75) 147(14.6,8.25) 148(14.6,8.75) 149(14.6,9.25) 150(14.6,9.75) 151(14.6,10.25) 152(14.6,10.75) 153(14.6,11.25) 154(14.6,11.75) 155(14.6,12.25) 156(14.6,12.75)
  oval 0.3x2.1 smd: 53(-12.75,-14.6) 54(-12.25,-14.6) 55(-11.75,-14.6) 56(-11.25,-14.6) 57(-10.75,-14.6) 58(-10.25,-14.6) 59(-9.75,-14.6) 60(-9.25,-14.6) 61(-8.75,-14.6) 62(-8.25,-14.6) 63(-7.75,-14.6) 64(-7.25,-14.6) 65(-6.75,-14.6) 66(-6.25,-14.6) 67(-5.75,-14.6) 68(-5.25,-14.6) 69(-4.75,-14.6) 70(-4.25,-14.6) 71(-3.75,-14.6) 72(-3.25,-14.6) 73(-2.75,-14.6) 74(-2.25,-14.6) 75(-1.75,-14.6) 76(-1.25,-14.6) 77(-0.75,-14.6) 78(-0.25,-14.6) 79(0.25,-14.6) 80(0.75,-14.6) 81(1.25,-14.6) 82(1.75,-14.6) 83(2.25,-14.6) 84(2.75,-14.6) 85(3.25,-14.6) 86(3.75,-14.6) 87(4.25,-14.6) 88(4.75,-14.6) 89(5.25,-14.6) 90(5.75,-14.6) 91(6.25,-14.6) 92(6.75,-14.6) 93(7.25,-14.6) 94(7.75,-14.6) 95(8.25,-14.6) 96(8.75,-14.6) 97(9.25,-14.6) 98(9.75,-14.6) 99(10.25,-14.6) 100(10.75,-14.6) 101(11.25,-14.6) 102(11.75,-14.6) 103(12.25,-14.6) 104(12.75,-14.6) 157(12.75,14.6) 158(12.25,14.6) 159(11.75,14.6) 160(11.25,14.6) 161(10.75,14.6) 162(10.25,14.6) 163(9.75,14.6) 164(9.25,14.6) 165(8.75,14.6) 166(8.25,14.6) 167(7.75,14.6) 168(7.25,14.6) 169(6.75,14.6) 170(6.25,14.6) 171(5.75,14.6) 172(5.25,14.6) 173(4.75,14.6) 174(4.25,14.6) 175(3.75,14.6) 176(3.25,14.6) 177(2.75,14.6) 178(2.25,14.6) 179(1.75,14.6) 180(1.25,14.6) 181(0.75,14.6) 182(0.25,14.6) 183(-0.25,14.6) 184(-0.75,14.6) 185(-1.25,14.6) 186(-1.75,14.6) 187(-2.25,14.6) 188(-2.75,14.6) 189(-3.25,14.6) 190(-3.75,14.6) 191(-4.25,14.6) 192(-4.75,14.6) 193(-5.25,14.6) 194(-5.75,14.6) 195(-6.25,14.6) 196(-6.75,14.6) 197(-7.25,14.6) 198(-7.75,14.6) 199(-8.25,14.6) 200(-8.75,14.6) 201(-9.25,14.6) 202(-9.75,14.6) 203(-10.25,14.6) 204(-10.75,14.6) 205(-11.25,14.6) 206(-11.75,14.6) 207(-12.25,14.6) 208(-12.75,14.6)
Top Overlay:
  circle w0.25: c-14.6,13.45 r0.125
  circle w0.6: c-12.15,12.15 r0.3
  lines w0.2: -13.15,-13.15 -13.15,13.15 13.15,13.15 13.15,-13.15 -13.15,-13.15
Top Assembly:
  lines w0.127: -15.85,-15.85 -15.85,15.85 15.85,15.85 15.85,-15.85 -15.85,-15.85
  text ".Designator" at -2.275,-0.875 h2
Top Component Center:
  lines w0.127: -1,0 1,0 ; 0,-1 0,1
3D body "LQFP-208.step": height 1.4, standoff 0, extent -14.75,-14.75 14.75,14.75

## MSOP-8 [mm]
pads (8):
  rect 1.1x0.4 smd: 1(-2,0.975) 2(-2,0.325) 3(-2,-0.325) 4(-2,-0.975) 5(2,-0.975) 6(2,-0.325) 7(2,0.325) 8(2,0.975)
Top Overlay:
  circle w0.25: c-2,1.75 r0.1
  lines w0.2: -0.525,1.3 -1.125,1.3 -1.125,-1.3 1.15,-1.3 1.15,1.3 0.55,1.3 cw(c0.017,1.3) -0.517,1.3
Top Assembly:
  lines w0.127: -2.725,-1.35 -2.725,1.35 2.725,1.35 2.725,-1.35 -2.725,-1.35
  text ".Designator" at 0.3,-1.125 h0.8
Top Component Center:
  lines w0.127: -0.5,0 0.5,0 ; 0,-0.5 0,0.5
3D body "MSOP-8.STEP": height 1.1, standoff 0, extent -2.45,-1.5 2.45,1.5